# Altium footprint library lib.PcbLib: 145 footprints (part 8 of 10)
Each footprint in its own frame and in the unit in brackets; x right, y up, seen from the top. Pads: shape width x height; smd on the part's side, far side on the other; paste and mask are expansions set on the pad; w line width, h text height; cw(c..) or ccw(c..) is an arc to the next point about the centre after c.
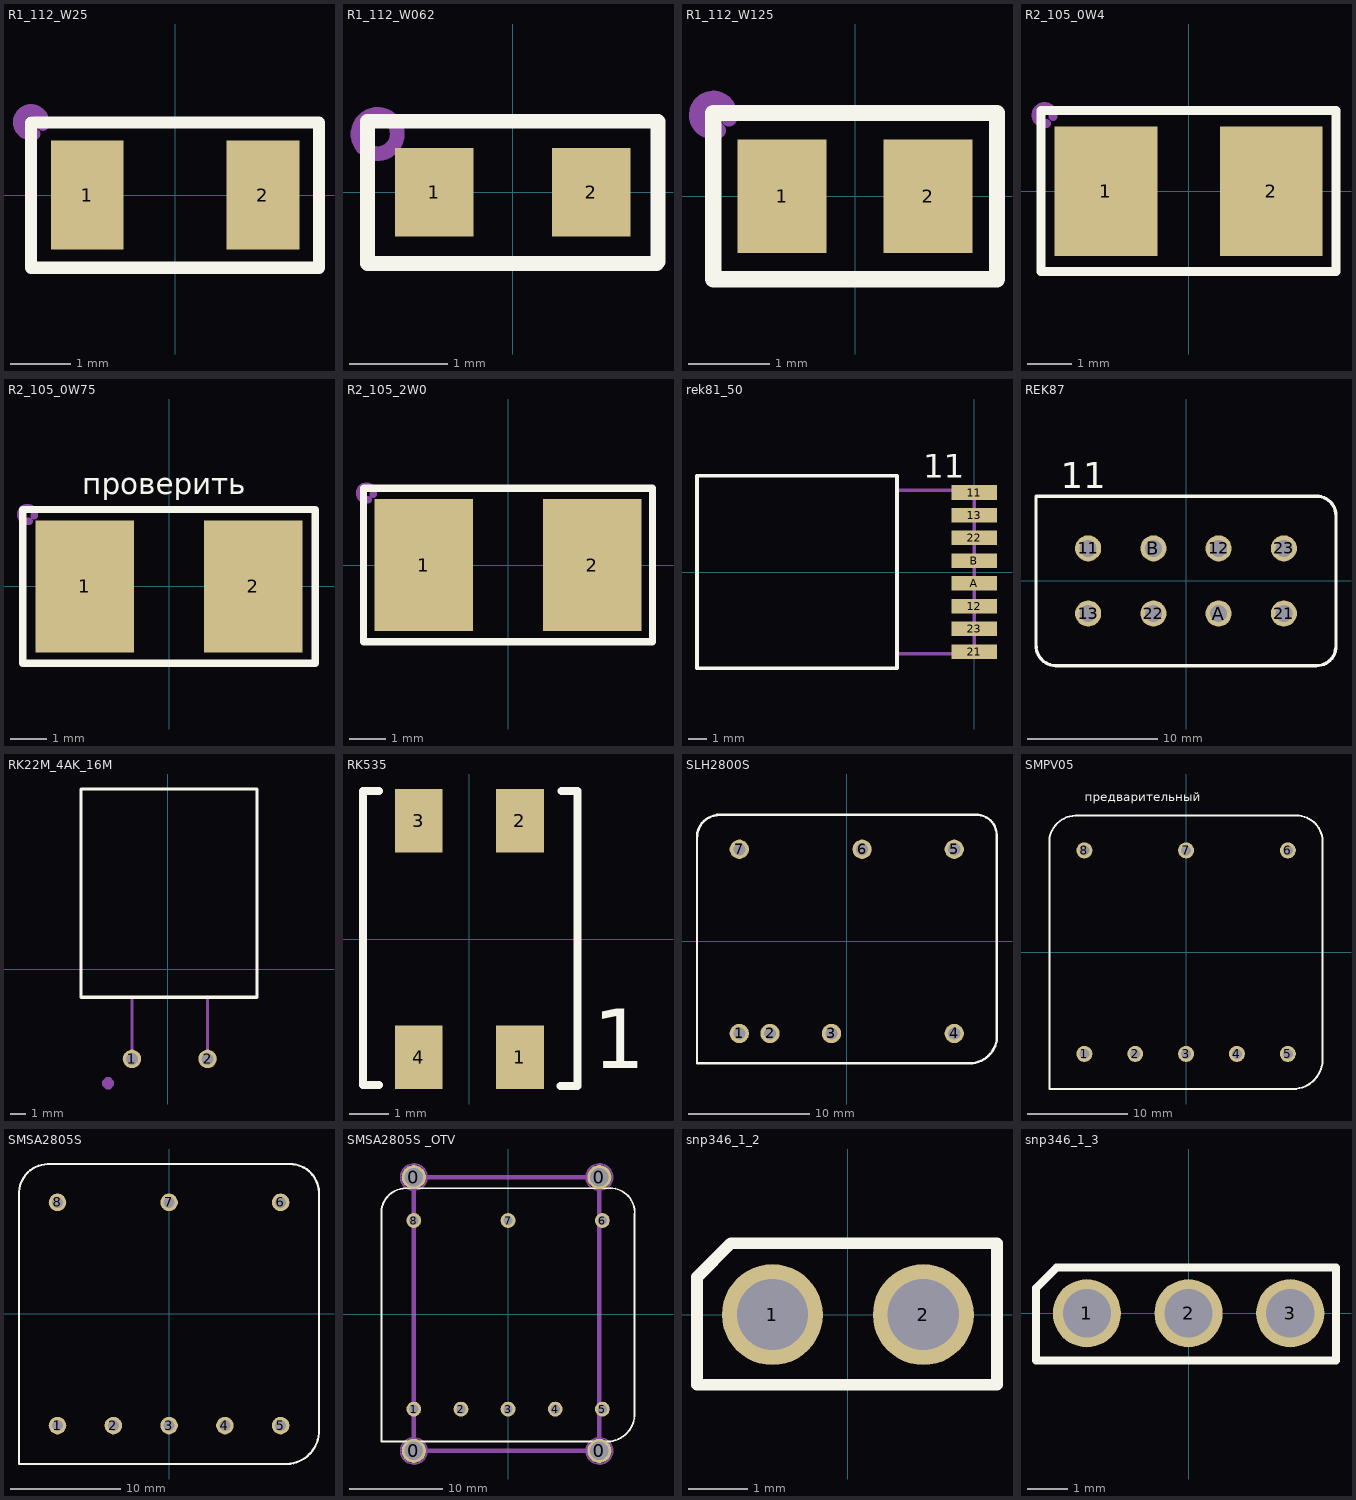
[diagram p7: the footprints below, top view; thin cyan lines are the x and y axes]

## R1_112_W25 [mm]
height 0.8
pads (2):
  rect 1.2x1.8 smd: 1(-1.45,0) 2(1.45,0)
Top Overlay:
  lines w0.2: -2.375,-1.2 2.375,-1.2 2.375,1.2 -2.375,1.2 -2.375,-1.2
Mechanical 25:
  lines w0.2: -2.318,1.008 cw(c-2.375,1.2) -2.18,1.157
3D body: height 0.6, standoff 0, extent -1.6,-0.8 1.6,0.8

## R1_112_W062 [mm]
height 0.6
pads (2):
  rect 0.8x0.9 smd: 1(-0.8,0) 2(0.8,0)
Top Overlay:
  lines w0.15: -1.48,-0.725 1.468,-0.725 ; -1.48,-0.707 -1.48,0.722 ; -1.48,0.725 1.468,0.725 ; 1.48,-0.707 1.48,0.722
Mechanical 25:
  circle w0.15: c-1.377,0.594 r0.2
3D body: height 0.4, standoff 0, extent -0.8,-0.4 0.8,0.4

## R1_112_W125 [mm]
height 0.8
pads (2):
  rect 1.1x1.4 smd: 1(-0.9,0) 2(0.9,0)
Top Overlay:
  lines w0.2: -1.75,-1.025 -1.75,1.025 1.75,1.025 1.75,-1.025 -1.75,-1.025
Mechanical 25:
  lines w0.2: -1.693,0.808 cw(c-1.75,1) -1.555,0.957
3D body: height 0.6, standoff 0, extent -1,-0.625 1,0.625

## R2_105_0W4 [mm] "m=0,1g"
height 0.8
pads (2):
  rect 2.3x2.9 smd: 1(-1.85,0) 2(1.85,0)
Top Overlay:
  lines w0.2: -3.3,-1.8 3.3,-1.8 3.3,1.8 -3.3,1.8 -3.3,-1.8
Mechanical 25:
  lines w0.2: -3.175,1.516 cw(c-3.225,1.7) -3.038,1.664

## R2_105_0W75 [mm] "m=0.15, корпус2515"
height 0.8
pads (2):
  rect 2.7x3.6 smd: 1(-2.3,0) 2(2.3,0)
Top Overlay:
  lines w0.2: -4,-2.1 -4,2.1 4,2.1 4,-2.1 -4,-2.1
  text "проверить" at -2.375,2.325 h1
Mechanical 25:
  lines w0.2: -3.818,1.783 cw(c-3.867,1.968) -3.68,1.932

## R2_105_2W0 [mm] "m=0.15, корпус2515"
height 0.9
pads (2):
  rect 2.7x3.6 smd: 1(-2.3,0) 2(2.3,0)
Top Overlay:
  lines w0.2: -3.95,-2.1 -3.95,2.1 3.95,2.1 3.95,-2.1 -3.95,-2.1
Mechanical 25:
  lines w0.2: -3.818,1.783 cw(c-3.867,1.968) -3.68,1.932
3D body: height 0.6, standoff 0, extent -3.2,-1.6 3.2,1.6

## rek81_50 [mm]
height 6
pads (8):
  rect 2.5x0.8 smd: 11(0,4.375) 12(0,-1.875) 13(0,3.125) 21(0,-4.375) 22(0,1.875) 23(0,-3.125) A(0,-0.625) B(0,0.625)
Top Overlay:
  lines w0.2: -15.25,-5.3 -4.25,-5.3 -4.25,5.3 -15.25,5.3 -15.25,-5.3
  text "11" at -2.8,5.2 h1.31
Mechanical 5:
  lines w0.2: -4.2,-4.5 -0.2,-4.5 ; -4.2,4.5 0,4.5 ; -0.2,-4.5 0,-4.3 ; -0.2,-4.5 0,-4.3 ; 0,-4.3 0,4.5 ; 0,4.5 0,4.5
Mechanical 25:
  text "21" at 1.5,-5 h2
  text "23" at -3.3,-3.7 h2
  text "12" at 1.7,-2.4 h2
  text "A" at -3.1,-1.1 h2
  text "B" at 1.9,0 h2
  text "22" at -3.5,1.2 h2
  text "13" at 1.7,2.6 h2
  text "11" at -3.4,3.9 h2

## REK87 [mm]
height 13.5
pads (8):
  round 2 hole 1.3: 11(-7.5,2.5) 12(2.5,2.5) 13(-7.5,-2.5) 21(7.5,-2.5) 22(-2.5,-2.5) 23(7.5,2.5) A(2.5,-2.5) B(-2.5,2.5)
Top Overlay:
  lines w0.254: -11.5,-4.9 ccw(c-9.95,-4.95) -10,-6.5 10,-6.5 ccw(c10,-5) 11.5,-5 11.5,5 ccw(c10,5) 10,6.5 -11.5,6.5 -11.5,-4.9
  text "11" at -9.6,7.1 h2
Mechanical 25:
  text "11" at -8.25,4.25 h2
  text "B" at -3,4.25 h2
  text "12" at 1.5,4.25 h2
  text "23" at 6.5,4.25 h2
  text "13" at -8.25,-5.5 h2
  text "22" at -3.25,-5.5 h2
  text "A" at 2,-5.5 h2
  text "21" at 6.75,-5.5 h2

## RK22M_4AK_16M [mm] "резонатор"
height 5.3
pads (2):
  round 1.2 hole 0.8: 1(-2.325,-5.825) 2(2.575,-5.825)
Top Overlay:
  lines w0.2: 0.075,-1.825 5.775,-1.825 5.775,11.675 -5.625,11.675 -5.625,-1.825 0.275,-1.825
Mechanical 5:
  lines w0.2: -2.325,-5.825 -2.325,-1.825 ; 2.575,-5.825 2.575,-1.825
Mechanical 25:
  region: -4.25,-7.525 -4,-7.775 -3.75,-7.775 -3.5,-7.525 -3.5,-7.275 -3.75,-7.025 -4,-7.025 -4.25,-7.275
  text "1" at -3.925,-6.5 h2
  text "2" at 0.975,-6.5 h2

## RK535 [mm]
height 1.35
pads (4):
  rect 1.2x1.6 smd: 1(1.275,-2.975) 2(1.275,2.975) 3(-1.275,2.975) 4(-1.275,-2.975)
Top Overlay:
  lines w0.2: -2.275,-3.675 -2.675,-3.675 -2.675,3.725 -2.275,3.725 ; 2.3,-3.7 2.725,-3.7 2.725,3.725 2.325,3.725
  text "1" at 3.125,-3.25 h1.5
Mechanical 25:
  text "3" at -2.65,2.525 h1.2
  text "2" at 2.15,2.65 h1.2
  text "4" at -2.75,-3.3 h1.2
  text "1" at 2.275,-3.225 h1.2
3D body: height 1.35, standoff 0, extent -2.7,-3.7 2.7,3.7

## SLH2800S [mm] "SLH2805D/HP, dvch2800d"
height 7
pads (7):
  round 1.6 hole 1: 1(-8.89,-7.62) 2(-6.35,-7.62) 3(-1.27,-7.62) 4(8.89,-7.62) 5(8.89,7.62) 6(1.27,7.62) 7(-8.89,7.62)
Top Overlay:
  lines w0.2: -12.39,8.6 -12.39,-10.07 10.41,-10.07 ccw(c10.168,-7.823) 12.397,-8.193 ; -12.387,8.511 cw(c-10.557,8.616) -10.765,10.438 ; -10.74,10.46 10.84,10.46 ; 10.87,10.47 cw(c10.725,8.799) 12.39,8.6 ; 12.41,-8.17 12.41,8.66
Mechanical 25:
  text "1" at -9.248,-6.287 h2
  text "4" at 8.398,-6.319 h2
  text "5" at 8.622,5.253 h2
  text "7" at -9.216,4.678 h2
3D body: height 7, standoff 0, extent -12.35,-10.15 12.4,10.45

## SMPV05 [mm]
height 10
pads (8):
  round 1.6 hole 1: 1(-10.16,-10.16) 2(-5.08,-10.16) 3(0,-10.16) 4(5.08,-10.16) 5(10.16,-10.16) 6(10.16,10.16) 7(0,10.16) 8(-10.16,10.16)
Top Overlay:
  lines w0.2: -13.66,10.84 cw(c-11.002,10.979) -11.06,13.64 10.74,13.64 cw(c10.998,11.005) 13.64,10.84 13.64,-10.46 ; -13.66,11.04 -13.66,-13.66 10.74,-13.66 ccw(c10.65,-10.67) 13.64,-10.56
  text "предварительный" at -10.1,14.8 h1.5
Mechanical 25:
  text "6" at 10.988,8.774 h2
  text "8" at -12.312,8.874 h2
  text "5" at 11.188,-11.426 h2
  text "1" at -12.68,-11.426 h2

## SMSA2805S [mm]
height 7
pads (8):
  round 1.6 hole 1: 1(-10.16,-10.16) 2(-5.08,-10.16) 3(0,-10.16) 4(5.08,-10.16) 5(10.16,-10.16) 6(10.16,10.16) 7(0,10.16) 8(-10.16,10.16)
Top Overlay:
  lines w0.2: -13.66,10.84 cw(c-11.002,10.979) -11.06,13.64 10.74,13.64 cw(c10.998,11.005) 13.64,10.84 13.64,-10.46 ; -13.66,11.04 -13.66,-13.66 10.74,-13.66 ccw(c10.65,-10.67) 13.64,-10.56
Mechanical 25:
  text "6" at 10.988,8.774 h2
  text "8" at -12.312,8.874 h2
  text "5" at 11.188,-11.426 h2
  text "1" at -12.68,-11.426 h2
3D body: height 7, standoff 0.5, extent -13.7,-13.7 13.7,13.6

## SMSA2805S _OTV [mm]
height 7
pads (12):
  round 2.6 hole 2: 0(-10.16,-14.75) 0(-10.16,14.75) 0(9.84,-14.75) 0(9.84,14.75)
  round 1.6 hole 1: 1(-10.16,-10.25) 2(-5.08,-10.25) 3(0,-10.25) 4(5.08,-10.25) 5(10.16,-10.25) 6(10.16,10.07) 7(0,10.07) 8(-10.16,10.07)
Top Overlay:
  lines w0.2: -13.66,10.75 cw(c-11.002,10.889) -11.06,13.55 10.74,13.55 cw(c10.998,10.915) 13.64,10.75 13.64,-10.55 ; -13.66,10.95 -13.66,-13.75 10.74,-13.75 ccw(c10.65,-10.76) 13.64,-10.65
Mechanical 5:
  circle w0.2: c-10.16,14.75 r1.414
  circle w0.2: c9.84,14.75 r1.414
  circle w0.2: c9.84,-14.75 r1.414
  circle w0.2: c-10.16,-14.75 r1.414
  lines w0.5: -10.16,-14.75 -10.16,14.75 ; 9.84,-14.75 9.84,14.75
Mechanical 6:
  circle w0.2: c-10.16,-14.75 r1.414
  circle w0.2: c9.84,-14.75 r1.414
  circle w0.2: c9.84,14.75 r1.414
  circle w0.2: c-10.16,14.75 r1.414
  lines w0.5: -10.16,-14.75 9.84,-14.75 ; -10.16,14.75 9.84,14.75
Mechanical 25:
  text "1" at -12.68,-11.516 h2
  text "5" at 11.188,-11.516 h2
  text "8" at -12.312,8.784 h2
  text "6" at 10.988,8.684 h2
3D body: height 7, standoff 0.5, extent -13.7,-13.65 13.7,13.65

## snp346_1_2 [mm]
height 8.8
pads (2):
  round 1.7 hole 1.2: 1(-1.27,0) 2(1.27,0)
Top Overlay:
  lines w0.2: -2.54,-1.18 -2.54,0.63 -1.97,1.2 2.51,1.2 2.51,-1.18 -2.54,-1.18
Mechanical 25:
  text "1" at -3.048,-0.889 h2
  text "2" at 2.7,-0.8 h2
3D body: height 2.6, standoff 0, extent -2.55,-1.175 2.525,1.15
3D body: height 6.2, standoff 0, extent -1.75,-0.4 -0.75,0.6
3D body: height 6.2, standoff 0, extent 0.75,-0.425 1.75,0.575

## snp346_1_3 [mm]
height 8.8
pads (3):
  round 1.7 hole 1.2: 1(-2.54,0) 2(0,0) 3(2.54,0)
Top Overlay:
  lines w0.2: -3.29,1.143 -3.292,1.143 ; -3.292,1.143 -3.81,0.625 -3.81,-1.18 3.683,-1.18 3.683,1.143 -3.292,1.143
Mechanical 25:
  text "3" at 3.6,-0.7 h2
  text "1" at -4.318,-0.889 h2
3D body: height 2.6, standoff 0, extent -3.8,-1.175 3.7,1.15
3D body: height 6.2, standoff 0, extent -3,-0.4 -2,0.6
3D body: height 6.2, standoff 0, extent -0.5,-0.425 0.5,0.575
3D body: height 6.2, standoff 0, extent 2.05,-0.475 3.05,0.525